# Altium footprint library my_lib.PcbLib: 121 footprints (part 5 of 8)
Each footprint in its own frame and in the unit in brackets; x right, y up, seen from the top. Pads: shape width x height; smd on the part's side, far side on the other; paste and mask are expansions set on the pad; w line width, h text height; cw(c..) or ccw(c..) is an arc to the next point about the centre after c.
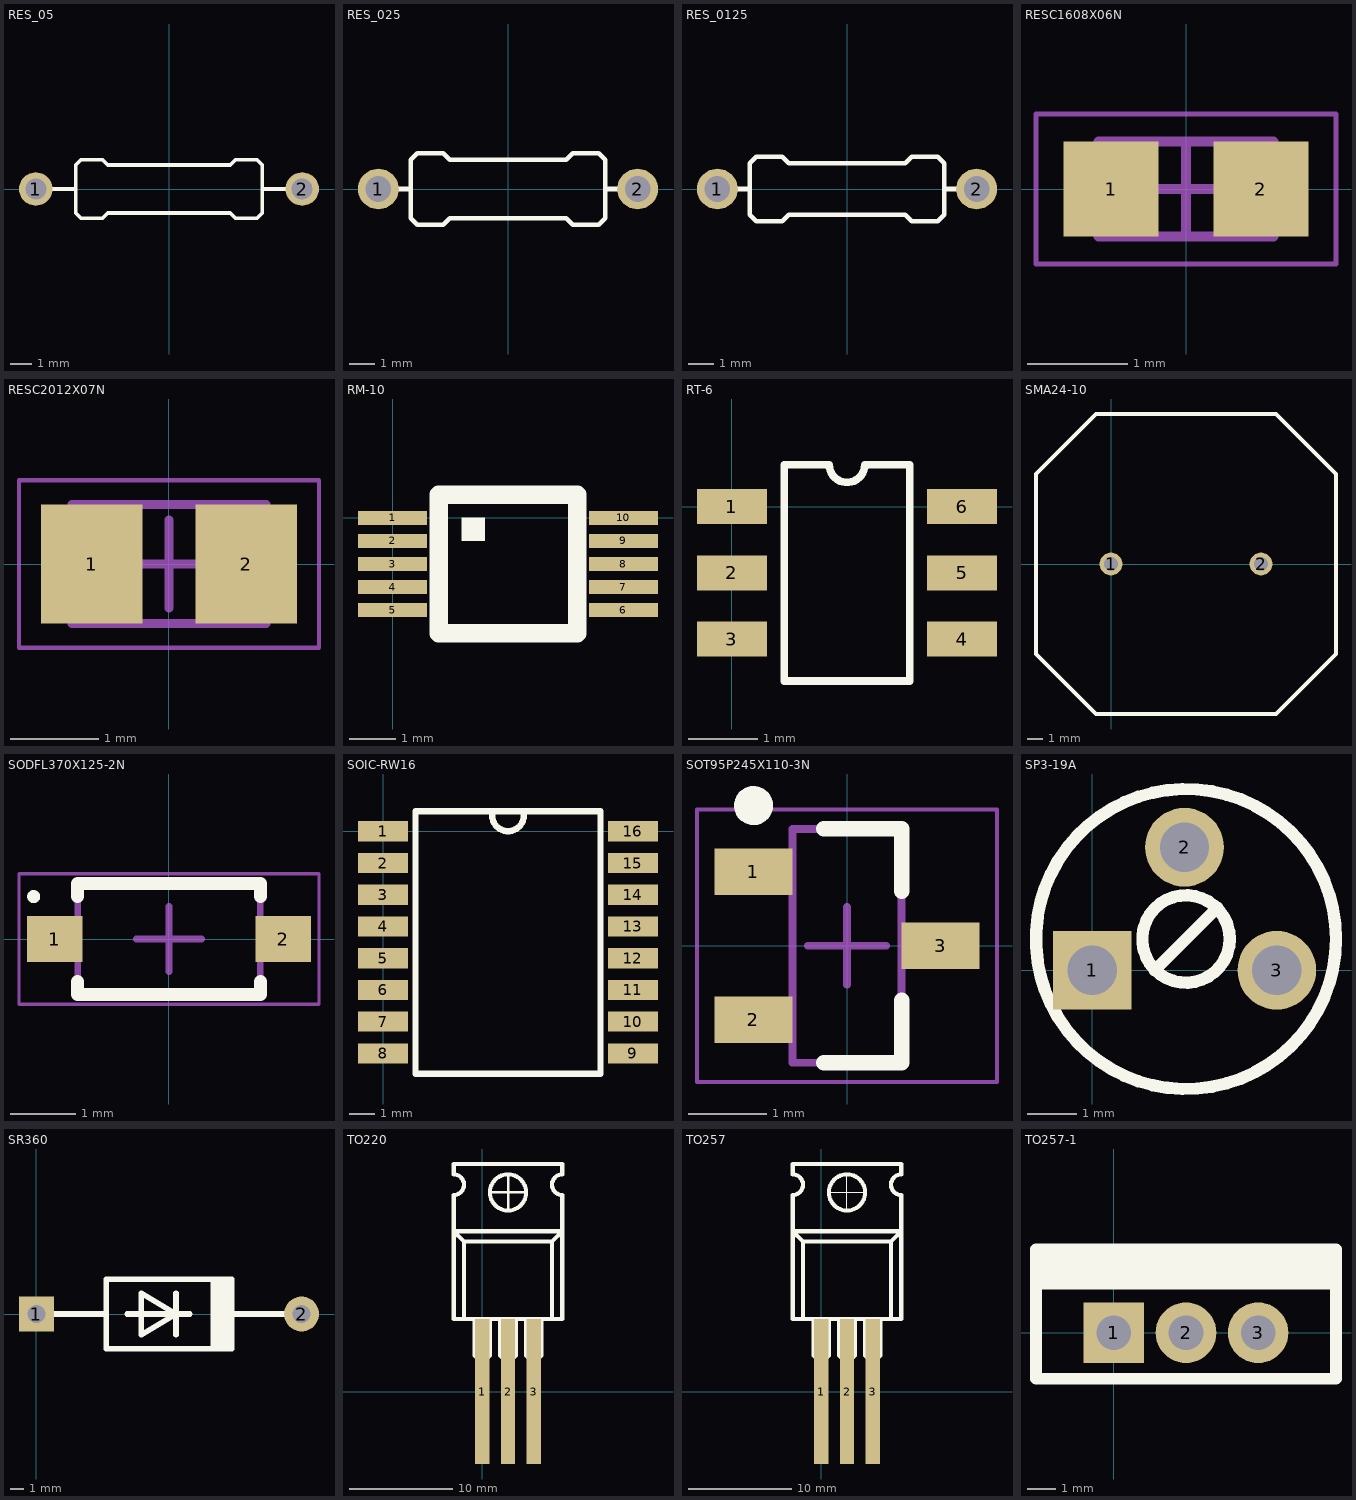
[diagram p4: the footprints below, top view; thin cyan lines are the x and y axes]

## RES_05 [mm]
pads (2):
  round 1.6 hole 1: 1(-6.35,0) 2(6.35,0)
Top Overlay:
  lines w0.178: -6.35,0 -4.445,0 ; 4.445,0 6.35,0 ; -4.445,-1.143 -4.445,1.143 -4.191,1.397 -3.175,1.397 -2.921,1.143 2.921,1.143 3.175,1.397 4.191,1.397 4.445,1.143 4.445,-1.143 4.191,-1.397 3.175,-1.397 2.921,-1.143 -2.921,-1.143 -3.175,-1.397 -4.191,-1.397 -4.445,-1.143

## RES_025 [mm]
pads (2):
  round 1.6 hole 1: 1(-5.08,0) 2(5.08,0)
Top Overlay:
  lines w0.178: -5.08,0 -3.81,0 ; 3.81,0 5.08,0 ; -3.81,-1.143 -3.81,1.143 -3.556,1.397 -2.54,1.397 -2.286,1.143 2.286,1.143 2.54,1.397 3.556,1.397 3.81,1.143 3.81,-1.143 3.556,-1.397 2.54,-1.397 2.286,-1.143 -2.286,-1.143 -2.54,-1.397 -3.556,-1.397 -3.81,-1.143

## RES_0125 [mm]
pads (2):
  round 1.6 hole 1: 1(-5.08,0) 2(5.08,0)
Top Overlay:
  lines w0.178: -5.08,0 -3.81,0 ; 3.81,0 5.08,0 ; -3.81,-1.016 -3.81,1.016 -3.556,1.27 -2.54,1.27 -2.286,1.016 2.286,1.016 2.54,1.27 3.556,1.27 3.81,1.016 3.81,-1.016 3.556,-1.27 2.54,-1.27 2.286,-1.016 -2.286,-1.016 -2.54,-1.27 -3.556,-1.27 -3.81,-1.016

## RESC1608X06N [mm] "Chip Resistor, 2-Leads, Body 1,60x0,85mm, IPC Medium Density"
height 0.55
pads (2):
  rect 0.95x0.95 smd: 1(-0.75,0) 2(0.75,0)
Mechanical 13:
  lines w0.1: -0.875,-0.475 -0.875,0.475 0.875,0.475 0.875,-0.475 -0.875,-0.475
Mechanical 15:
  lines w0.05: -1.5,-0.75 -1.5,0.75 1.5,0.75 1.5,-0.75 -1.5,-0.75
  lines w0.1: -0.475,0 0.475,0 ; 0,-0.475 0,0.475
3D body "RESC1608X06N.step": height 0.55, standoff 0, extent -0.875,-0.475 0.875,0.475

## RESC2012X07N [mm] "Chip Resistor, 2-Leads, Body 2,00x1,25mm, IPC Medium Density"
height 0.7
pads (2):
  rect 1.15x1.35 smd: 1(-0.875,0) 2(0.875,0)
Mechanical 13:
  lines w0.1: -1.1,-0.675 -1.1,0.675 1.1,0.675 1.1,-0.675 -1.1,-0.675
Mechanical 15:
  lines w0.05: -1.7,-0.95 -1.7,0.95 1.7,0.95 1.7,-0.95 -1.7,-0.95
  lines w0.1: -0.5,0 0.5,0 ; 0,-0.5 0,0.5
3D body "RESC2012X07N.step": height 0.7, standoff 0, extent -1.1,-0.675 1.1,0.675

## RM-10 [mm]
pads (10):
  rect 1.5x0.3 smd: 1(0,0) 2(0,-0.5) 3(0,-1) 4(0,-1.5) 5(0,-2) 6(5,-2) 7(5,-1.5) 8(5,-1) 9(5,-0.5) 10(5,0)
Top Overlay:
  region: 1.5,0 1.5,-0.5 2,-0.5 2,0
  lines w0.4: 1,-2.5 4,-2.5 4,0.5 1,0.5 1,-2.5

## RT-6 [mm]
pads (6):
  rect 1x0.5 smd: 1(0,0) 2(0,-0.95) 3(0,-1.9) 4(3.3,-1.9) 5(3.3,-0.95) 6(3.3,0)
Top Overlay:
  lines w0.11: 0.75,-2.5 0.75,0.6 1.396,0.6 ccw(c1.65,0.6) 1.904,0.6 2.55,0.6 2.55,-2.5 0.75,-2.5

## SMA24-10 [mil]
pads (2):
  round 60 hole 38: 1(0,0) 2(393.7,0)
Top Overlay:
  lines w10: -196.85,-236.22 -196.85,236.22 -39.37,393.7 433.07,393.7 590.55,236.22 590.55,-236.22 433.07,-393.7 -39.37,-393.7 -196.85,-236.22

## SODFL370X125-2N [mm] "SODFL, 2-Leads, Body 1,60x3,70mm, IPC Medium Density"
height 1.25
pads (2):
  rect 0.85x0.7 smd: 1(-1.75,0) 2(1.75,0)
Top Overlay:
  circle w0.1: c-2.075,0.65 r0.05
  lines w0.2: -1.4,-0.65 -1.4,-0.85 1.4,-0.85 1.4,-0.65 ; -1.4,0.65 -1.4,0.85 1.4,0.85 1.4,0.65
Mechanical 13:
  lines w0.1: -1.4,-0.85 1.4,-0.85 1.4,0.85 -1.4,0.85 -1.4,-0.85
Mechanical 15:
  lines w0.05: -2.3,-1 2.3,-1 2.3,1 -2.3,1 -2.3,-1
  lines w0.1: -0.5,0 0.5,0 ; 0,-0.5 0,0.5
3D body "SODFL370X125-2N.step": height 1.25, standoff 0, extent -1.85,-0.85 1.85,0.85

## SOIC-RW16 [mm]
pads (16):
  rect 2x0.8 smd: 1(0,0) 2(0,-1.27) 3(0,-2.54) 4(0,-3.81) 5(0,-5.08) 6(0,-6.35) 7(0,-7.62) 8(0,-8.89) 9(10,-8.89) 10(10,-7.62) 11(10,-6.35) 12(10,-5.08) 13(10,-3.81) 14(10,-2.54) 15(10,-1.27) 16(10,0)
Top Overlay:
  lines w0.254: 4.365,0.635 ccw(c5,0.635) 5.635,0.635 ; 1.3,-9.695 8.7,-9.695 8.7,0.805 1.3,0.805 1.3,-9.695

## SOT95P245X110-3N [mm] "SOT23, 3-Leads, Body 2,90x2,45mm, Pitch 0,95mm, IPC Medium Density"
height 1.1
pads (3):
  rect 1x0.6 smd: 1(-1.2,0.95) 2(-1.2,-0.95) 3(1.2,0)
Top Overlay:
  circle w0.25: c-1.2,1.8 r0.125
  lines w0.2: -0.3,-1.5 0.7,-1.5 0.7,-0.7 ; -0.3,1.5 0.7,1.5 0.7,0.7
Mechanical 13:
  lines w0.1: -0.7,-1.5 0.7,-1.5 0.7,1.5 -0.7,1.5 -0.7,-1.5
Mechanical 15:
  lines w0.05: -1.925,-1.75 1.925,-1.75 1.925,1.75 -1.925,1.75 -1.925,-1.75
  lines w0.1: -0.5,0 0.5,0 ; 0,-0.5 0,0.5
3D body "SOT95P245X110-3N.step": height 1.1, standoff 0, extent -1.3,-1.5 1.3,1.5

## SP3-19A [mm]
pads (3):
  rect 1.6x1.6 hole 1: 1(0,0)
  round 1.6 hole 1: 2(1.875,2.5) 3(3.75,0)
Top Overlay:
  circle w0.25: c1.905,0.635 r0.889
  circle w0.25: c1.905,0.635 r3.048
  lines w0.25: 1.27,0 2.54,1.27

## SR360 [mm]
pads (2):
  rect 2.5x2.5 hole 1.3: 1(0,0)
  round 2.5 hole 1.3: 2(19,0)
Top Overlay:
  region: 12.5,2.5 12.5,-2.5 14,-2.5 14,2.5
  lines w0.4: 0,0 5,0 ; 6.5,0 11,0 ; 10,-1.5 10,1.5 ; 14,0 19,0 ; 5,-2.5 14,-2.5 14,2.5 5,2.5 5,-2.5 ; 7.5,-1.5 7.5,1.5 10,0 7.5,-1.5

## TO220 [mm]
pads (3):
  rect 1.4x14 smd: 1(0,0) 2(2.5,0) 3(5,0)
Top Overlay:
  region: 1.75,7 1.75,3.5 2.25,3 2.75,3 3.25,3.5 3.25,7
  region: 4.25,7 4.25,3.5 4.75,3 5.25,3 5.75,3.5 5.75,7
  region: -0.75,7 -0.75,3.5 -0.25,3 0.25,3 0.75,3.5 0.75,7
  lines w0.254: 0.74,19.26 4.24,19.26 ; 2.54,17.46 2.54,21.06
  lines w0.4: -1.75,7 -1.75,14.5 ; -0.75,7 -0.75,3.5 -0.25,3 0.25,3 0.75,3.5 0.75,7 ; 1.75,7 1.75,3.5 2.25,3 2.75,3 3.25,3.5 3.25,7 ; 4.25,7 4.25,3.5 4.75,3 5.25,3 5.75,3.5 5.75,7 ; 6.75,7 6.75,14.5 ; -1.75,14.5 6.75,14.5 ; -1.75,14.5 -2.75,15.5 7.75,15.5 6.75,14.5 ; -2.75,7 7.75,7 7.75,19 cw(c7.75,20) 7.75,21 7.75,22 -2.75,22 -2.75,21 cw(c-2.75,20) -2.75,19 -2.75,7 ; 0.75,19.25 ccw(c2.5,19.25) 4.25,19.25 ccw(c2.5,19.25) 0.75,19.25

## TO257 [mm]
pads (3):
  rect 1.4x14 smd: 1(0,0) 2(2.5,0) 3(5,0)
Top Overlay:
  region: -0.75,7 -0.75,3.5 -0.25,3 0.25,3 0.75,3.5 0.75,7
  region: 4.25,7 4.25,3.5 4.75,3 5.25,3 5.75,3.5 5.75,7
  region: 1.75,7 1.75,3.5 2.25,3 2.75,3 3.25,3.5 3.25,7
  lines w0.1: 0.74,19.26 4.24,19.26 ; 2.49,17.46 2.49,21.06
  lines w0.4: -1.75,7 -1.75,14.5 ; -0.75,7 -0.75,3.5 -0.25,3 0.25,3 0.75,3.5 0.75,7 ; 1.75,7 1.75,3.5 2.25,3 2.75,3 3.25,3.5 3.25,7 ; 4.25,7 4.25,3.5 4.75,3 5.25,3 5.75,3.5 5.75,7 ; 6.75,7 6.75,14.5 ; -1.75,14.5 -2.75,15.5 7.75,15.5 6.75,14.5 ; -1.75,14.5 6.75,14.5 ; -2.75,7 -2.75,19 ccw(c-2.75,20) -2.75,21 -2.75,22 7.75,22 7.75,21 ccw(c7.75,20) 7.75,19 7.75,7 -2.75,7 ; 0.75,19.25 cw(c2.5,19.25) 4.25,19.25 cw(c2.5,19.25) 0.75,19.25

## TO257-1 [mm]
pads (3):
  rect 2.1x2.1 hole 1.2 unplated: 1(0,0)
  round 2.1 hole 1.2 unplated: 2(2.5,0) 3(5,0)
Top Overlay:
  region: -2.7,2.9 -2.7,1.7 7.7,1.7 7.7,2.9
  lines w0.4: -2.7,1.7 7.7,1.7 ; -2.7,-1.6 7.7,-1.6 7.7,2.9 -2.7,2.9 -2.7,-1.6